# Altium integrated library rfm_dev_board.IntLib: 21 symbols
Pins are listed as number, name and electrical type; pins without a type are passive.

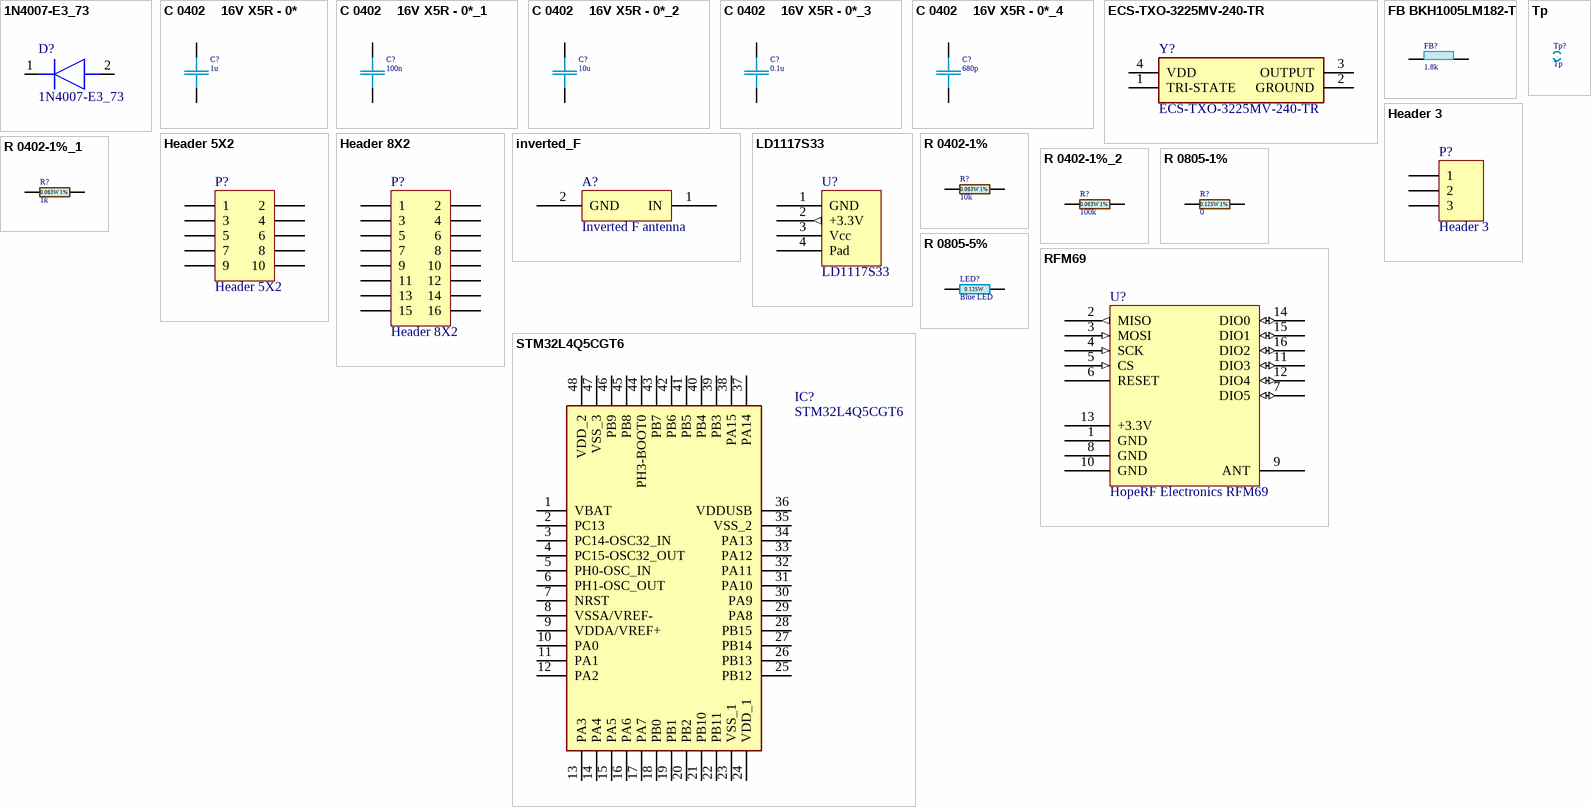
[diagram p0: symbols 1N4007-E3_73 to Tp]

## 1N4007-E3_73
designator D?
Diode; Manufacturer_Name: Vishay; Manufacturer_Part_Number: 1N4007-E3/73; Datasheet Link: https://mouser.componentsearchengine.com/Datasheets/2/1N4007-E3_73.pdf; Mouser Part Number: 625-1N4007-E3/73; Mouser Price/Stock: https://www.mouser.co.uk/ProductDetail/Vishay-General-Semiconductor/1N4007-E3-73?qs=N4vtoAxH%2FSqT3Ng3e4K0Gw%3D%3D; Arrow Part Number: 1N4007-E3/73; Arrow Price/Stock: https://www.arrow.com/en/products/1n4007-e373/vishay?region=europe
footprint DIOAD1405W86L465D235
pins: 1 K, 2 A

## C 0402    16V X5R - 0*
designator C?, comment 1u
SMD 0402     16V X5R 10%; Manufacturer: Samsung; TYPE: Capacitors; Tolerance %: ±20%; Package-mm: 1005; Part Number: *; Mount Type: SMT; Publisher: Hefest; Manufacturer Alternate: *; Part Number Alternate: *; Published: 07.04.2019; Supplier 1: Comet; Supplier Part Number 1: *; RoHS: Y; Technology: Ceramic  MLCC; Package: 0402; VDC: 16V; TempCo: X5R; VAC: *; ESR Ohm: *; ComponentLink1Description: Datasheet Link; ComponentLink1URL: https://store.comet.bg/download-file.php?id=11; Temperature Range: -55°C ~ +85°C; Price: *; Value: 1u
footprint C 0402(1005)x0.5
simulation model Capacitor (Model Description)
signal-integrity model Capacitor (Model Description)
pins: 1, 2
1 alternate drawing of the same symbol

## C 0402    16V X5R - 0*_1
designator C?, comment 100n
SMD 0402     16V X5R 10%; Manufacturer: Samsung; TYPE: Capacitors; Tolerance %: ±20%; Package-mm: 1005; Part Number: *; Mount Type: SMT; Publisher: Hefest; Manufacturer Alternate: *; Part Number Alternate: *; Published: 07.04.2019; Supplier 1: Comet; Supplier Part Number 1: *; RoHS: Y; Technology: Ceramic  MLCC; Package: 0402; VDC: 16V; TempCo: X5R; VAC: *; ESR Ohm: *; ComponentLink1Description: Datasheet Link; ComponentLink1URL: https://store.comet.bg/download-file.php?id=11; Temperature Range: -55°C ~ +85°C; Price: *; Value: 100n
footprint C 0402(1005)x0.5
simulation model Capacitor (Model Description)
signal-integrity model Capacitor (Model Description)
pins: 1, 2
1 alternate drawing of the same symbol

## C 0402    16V X5R - 0*_2
designator C?, comment 10u
SMD 0402     16V X5R 10%; Manufacturer: Samsung; TYPE: Capacitors; Tolerance %: ±20%; Package-mm: 1005; Part Number: *; Mount Type: SMT; Publisher: Hefest; Manufacturer Alternate: *; Part Number Alternate: *; Published: 07.04.2019; Supplier 1: Comet; Supplier Part Number 1: *; RoHS: Y; Technology: Ceramic  MLCC; Package: 0402; VDC: 16V; TempCo: X5R; VAC: *; ESR Ohm: *; ComponentLink1Description: Datasheet Link; ComponentLink1URL: https://store.comet.bg/download-file.php?id=11; Temperature Range: -55°C ~ +85°C; Price: *; Value: 10u
footprint C 0402(1005)x0.5
simulation model Capacitor (Model Description)
signal-integrity model Capacitor (Model Description)
pins: 1, 2
1 alternate drawing of the same symbol

## C 0402    16V X5R - 0*_3
designator C?, comment 0.1u
SMD 0402     16V X5R 10%; Manufacturer: Samsung; TYPE: Capacitors; Tolerance %: ±20%; Package-mm: 1005; Part Number: *; Mount Type: SMT; Publisher: Hefest; Manufacturer Alternate: *; Part Number Alternate: *; Published: 07.04.2019; Supplier 1: Comet; Supplier Part Number 1: *; RoHS: Y; Technology: Ceramic  MLCC; Package: 0402; VDC: 16V; TempCo: X5R; VAC: *; ESR Ohm: *; ComponentLink1Description: Datasheet Link; ComponentLink1URL: https://store.comet.bg/download-file.php?id=11; Temperature Range: -55°C ~ +85°C; Price: *; Value: 0.1u
footprint C 0402(1005)x0.5
simulation model Capacitor (Model Description)
signal-integrity model Capacitor (Model Description)
pins: 1, 2
1 alternate drawing of the same symbol

## C 0402    16V X5R - 0*_4
designator C?, comment 680p
SMD 0402     16V X5R 10%; Manufacturer: Samsung; TYPE: Capacitors; Tolerance %: ±20%; Package-mm: 1005; Part Number: *; Mount Type: SMT; Publisher: Hefest; Manufacturer Alternate: *; Part Number Alternate: *; Published: 07.04.2019; Supplier 1: Comet; Supplier Part Number 1: *; RoHS: Y; Technology: Ceramic  MLCC; Package: 0402; VDC: 16V; TempCo: X5R; VAC: *; ESR Ohm: *; ComponentLink1Description: Datasheet Link; ComponentLink1URL: https://store.comet.bg/download-file.php?id=11; Temperature Range: -55°C ~ +85°C; Price: *; Value: 680p
footprint C 0402(1005)x0.5
simulation model Capacitor (Model Description)
signal-integrity model Capacitor (Model Description)
pins: 1, 2
1 alternate drawing of the same symbol

## ECS-TXO-3225MV-240-TR
designator Y?
Crystal or Oscillator; Manufacturer_Name: ECS; Datasheet Link: https://eu.mouser.com/datasheet/2/122/ECS-TXO-3225MV-1634330.pdf; Height: 1.2mm; Manufacturer_Part_Number: ECS-TXO-3225MV-240-TR; Mouser Part Number: 520-TXO-3225MV-240-T; Mouser Price/Stock: https://www.mouser.co.uk/ProductDetail/ECS/ECS-TXO-3225MV-240-TR?qs=d0WKAl%252BL4KYXn7UuwSFJGQ%3D%3D; Arrow Part Number: ECS-TXO-3225MV-240-TR; Arrow Price/Stock: https://www.arrow.com/en/products/ecs-txo-3225mv-240-tr/ecs-international?region=nac
footprint ECSTXO3225MV240TR
pins: 1 TRI-STATE, 2 GROUND, 3 OUTPUT, 4 VDD

## FB BKH1005LM182-T
designator FB?, comment ZTyp@100MHz: 1.8k  (hidden comment: 0.525u)
SMD 0402    0.2A 1.8kΩ/2Ω; Part Number: BKH1005LM182-T; Manufacturer: Murata; TYPE: Ferrite Bead; Ind: 0.52uH; DC Resistance: 2Ω; Material: Ferrite; Package-mm: 1005; Tolerance %: ±25%; Ztyp@1GHz: 2.7k; Imax: 0.2A; Irms: *; Isat: *; Technology: Chip; Published: 07.04.2019; Publisher: Hefest; Mount Type: SMT; Package: 0402; ComponentLink1Description: Datasheet Link; ComponentLink1URL: https://www.mouser.bg/datasheet/2/396/mlci12_e-1516614.pdf; RoHS: Y; Manufacturer Alternate: *; Supplier 1: Mouser; Supplier Part Number 1: 963-BKH1005LM182-T; Part Number Alternate: *; Price: 0.2; Value: 0.525u; Temperature Range: -55°C ~ +125°C
signal-integrity model Inductor
simulation model Inductor
footprint FB 0402(1005)x0.5
pins: 1, 2
1 alternate drawing of the same symbol

## Header 3
designator P?
Header, 3-Pin; LatestRevisionDate: 17-Jul-2002; LatestRevisionNote: Re-released for DXP Platform.; Publisher: Altium Limited
footprint HDR1X3 (Connector; Header; 3 Position)
signal-integrity model Connector
pins: 1, 2, 3

## Header 5X2
designator P?
Header, 5-Pin, Dual row; LatestRevisionDate: 17-Jul-2002; LatestRevisionNote: Re-released for DXP Platform.; Publisher: Altium Limited
footprint HDR2X5 (Connector; Header; 5x2 Position)
signal-integrity model Connector
pins: 1, 2, 3, 4, 5, 6, 7, 8, 9, 10

## Header 8X2
designator P?
Header, 8-Pin, Dual row; LatestRevisionDate: 17-Jul-2002; LatestRevisionNote: Re-released for DXP Platform.; Publisher: Altium Limited
footprint HDR2X8 (Connector; Header; 8x2 Position)
signal-integrity model Connector
pins: 1, 2, 3, 4, 5, 6, 7, 8, 9, 10, 11, 12, 13, 14, 15, 16

## inverted_F
designator A?, comment Inverted F antenna  (net tie, no BOM)
footprint Invertef_F-footprint
pins: 1 IN, 2 GND

## LD1117S33
designator U?
Linear voltage regulator. / Uin, V: 15 V / Uout,V: 3,3 V / Iout,A: 0,8 A / Udrop, V: 1,1 V
footprint SOT230P700X180-4N (SOT223, 4-Leads, Body 6.50x7.00mm (avg), Pitch 2.30mm, IPC Medium Density)
pins: 1 GND, 2 +3.3V (out), 3 Vcc, 4 Pad

## R 0402-1%
designator R?, comment 10k
SMD 0402 0.063W 1%   50V; Manufacturer: YAGEO; TempCo: ±100ppm/°C; Package-mm: 1005; Value Code: 1001; Power: 0.0625W; Part Number: *; Mount Type: SMT; Publisher: Hefest; Manufacturer Alternate: *; Published: 07.04.2019; Supplier 1: Comet; Supplier Part Number 1: R0402 1.0K 1% YAG/ASJ; RoHS: Y; Technology: Thick film; Package: 0402; VDC: 50V; Tolerance %: ±1%; ComponentLink1Description: Datasheet Link; ComponentLink1URL: https://store.comet.bg/download-file.php?id=1224; Temperature Range: -55°C ~ +155°C; Price: 0.015; Part Number Alternate: *; TYPE: Resistor; Value: 10k
footprint R 0402(1005)-1%
simulation model Resistor (Model Description)
signal-integrity model Resistor (Model Description)
pins: 1, 2
1 alternate drawing of the same symbol
text: 0.063W 1%

## R 0402-1%_1
designator R?, comment 1k
SMD 0402 0.063W 1%   50V; Manufacturer: YAGEO; TempCo: ±100ppm/°C; Package-mm: 1005; Value Code: 1001; Power: 0.0625W; Part Number: *; Mount Type: SMT; Publisher: Hefest; Manufacturer Alternate: *; Published: 07.04.2019; Supplier 1: Comet; Supplier Part Number 1: R0402 1.0K 1% YAG/ASJ; RoHS: Y; Technology: Thick film; Package: 0402; VDC: 50V; Tolerance %: ±1%; ComponentLink1Description: Datasheet Link; ComponentLink1URL: https://store.comet.bg/download-file.php?id=1224; Temperature Range: -55°C ~ +155°C; Price: 0.015; Part Number Alternate: *; TYPE: Resistor; Value: 1k
footprint R 0402(1005)-1%
simulation model Resistor (Model Description)
signal-integrity model Resistor (Model Description)
pins: 1, 2
1 alternate drawing of the same symbol
text: 0.063W 1%

## R 0402-1%_2
designator R?, comment 100k
SMD 0402 0.063W 1%   50V; Manufacturer: YAGEO; TempCo: ±100ppm/°C; Package-mm: 1005; Value Code: 1001; Power: 0.0625W; Part Number: *; Mount Type: SMT; Publisher: Hefest; Manufacturer Alternate: *; Published: 07.04.2019; Supplier 1: Comet; Supplier Part Number 1: R0402 1.0K 1% YAG/ASJ; RoHS: Y; Technology: Thick film; Package: 0402; VDC: 50V; Tolerance %: ±1%; ComponentLink1Description: Datasheet Link; ComponentLink1URL: https://store.comet.bg/download-file.php?id=1224; Temperature Range: -55°C ~ +155°C; Price: 0.015; Part Number Alternate: *; TYPE: Resistor; Value: 100k
footprint R 0402(1005)-1%
simulation model Resistor (Model Description)
signal-integrity model Resistor (Model Description)
pins: 1, 2
1 alternate drawing of the same symbol
text: 0.063W 1%

## R 0805-1%
designator R?, comment 0
SMD 0805 0.125W 1% 150V; Manufacturer: YAGEO; TempCo: ±100ppm/°C; Package-mm: 2012; Value Code: 1001; Part Number: *; Mount Type: SMT; Publisher: Hefest; Manufacturer Alternate: *; Published: 07.04.2019; Supplier 1: Comet; Supplier Part Number 1: R0805 1.0K 1% YAG/ASJ; RoHS: Y; Technology: Thick film; Package: 0805; VDC: 150V; Tolerance %: ±1%; ComponentLink1Description: Datasheet Link; ComponentLink1URL: https://store.comet.bg/download-file.php?id=1224; Temperature Range: -55°C ~ +155°C; Price: 0.031; Part Number Alternate: *; TYPE: Resistor; Power: 0.125W; Value: 0
footprint R 0805(2012)-1%
simulation model Resistor (Model Description)
signal-integrity model Resistor (Model Description)
pins: 1, 2
1 alternate drawing of the same symbol
text: 0.125W 1%

## R 0805-5%
designator LED?, comment Blue LED
https://www.rcscomponents.kiev.ua/product/svitlodiod-0805-synii-kt-smd0805-b-kento_86409.html; Manufacturer: YAGEO; VDC: 150V; TempCo: ±100ppm/°C; Tolerance %: ±5%; TYPE: Resistor; Package-mm: 2012; Value Code: 102; Power: 0.125W; Part Number: *; Mount Type: SMT; Publisher: Hefest; Manufacturer Alternate: *; Published: 07.04.2019; Supplier 1: Comet; Supplier Part Number 1: R0805 1.0K 5% YAG; RoHS: Y; Technology: Thick film; Package: 0805; ComponentLink1Description: Datasheet Link; ComponentLink1URL: https://store.comet.bg/download-file.php?id=140; Temperature Range: -55°C ~ +155°C; Price: 0.029; Part Number Alternate: *; Value: Blue LED
footprint R 0805(2012)
simulation model Resistor (Model Description)
signal-integrity model Resistor (Model Description)
pins: 1, 2
1 alternate drawing of the same symbol

## RFM69
designator U?, comment HopeRF Electronics RFM69
footprint CAC-200P1600X1600-16N (Chip Array, Concave, 16-Leads, Pitch 2.00mm,  Body 16.00x16.00mm,  IPC Medium Density)
pins: 1 GND, 2 MISO (out), 3 MOSI (in), 4 SCK (in), 5 CS (in), 6 RESET, 7 DIO5 (io), 8 GND, 9 ANT, 10 GND, 11 DIO3 (io), 12 DIO4 (io), 13 +3.3V, 14 DIO0 (io), 15 DIO1 (io), 16 DIO2 (io)

## STM32L4Q5CGT6
designator IC?
Integrated Circuit; Manufacturer_Name: STMicroelectronics; Datasheet Link: https://www.st.com/resource/en/datasheet/stm32l4q5ag.pdf; Height: 1.6mm; Manufacturer_Part_Number: STM32L4Q5CGT6; Mouser Part Number: 511-STM32L4Q5CGT6; Mouser Price/Stock: https://www.mouser.co.uk/ProductDetail/STMicroelectronics/STM32L4Q5CGT6?qs=xZ%2FP%252Ba9zWqa0QI8asRSMRw%3D%3D
footprint QFP50P900X900X160-48N
pins: 1 VBAT, 2 PC13, 3 PC14-OSC32_IN, 4 PC15-OSC32_OUT, 5 PH0-OSC_IN, 6 PH1-OSC_OUT, 7 NRST, 8 VSSA/VREF-, 9 VDDA/VREF+, 10 PA0, 11 PA1, 12 PA2, 13 PA3, 14 PA4, 15 PA5, 16 PA6, 17 PA7, 18 PB0, 19 PB1, 20 PB2, 21 PB10, 22 PB11, 23 VSS_1, 24 VDD_1, 25 PB12, 26 PB13, 27 PB14, 28 PB15, 29 PA8, 30 PA9, 31 PA10, 32 PA11, 33 PA12, 34 PA13, 35 VSS_2, 36 VDDUSB, 37 PA14, 38 PA15, 39 PB3, 40 PB4, 41 PB5, 42 PB6, 43 PB7, 44 PH3-BOOT0, 45 PB8, 46 PB9, 47 VSS_3, 48 VDD_2

## Tp
designator Tp?  (no BOM)
TestPoint; TYPE: TestPoint; Technology: PCB; Mount Type: SMT; Package: TestPoint; Published: 07.04.2019; Publisher: Hefest; Value: Tp
footprint Tp-0.5
footprint Tp-0.6
footprint Tp-0.7
footprint Tp-0.8
footprint Tp-0.4
pins: 1
1 alternate drawing of the same symbol